# Altium footprint library BTL_PCBLIB.PcbLib: 31 footprints (part 2 of 2)
Each footprint in its own frame and in the unit in brackets; x right, y up, seen from the top. Pads: shape width x height; smd on the part's side, far side on the other; paste and mask are expansions set on the pad; w line width, h text height; cw(c..) or ccw(c..) is an arc to the next point about the centre after c.
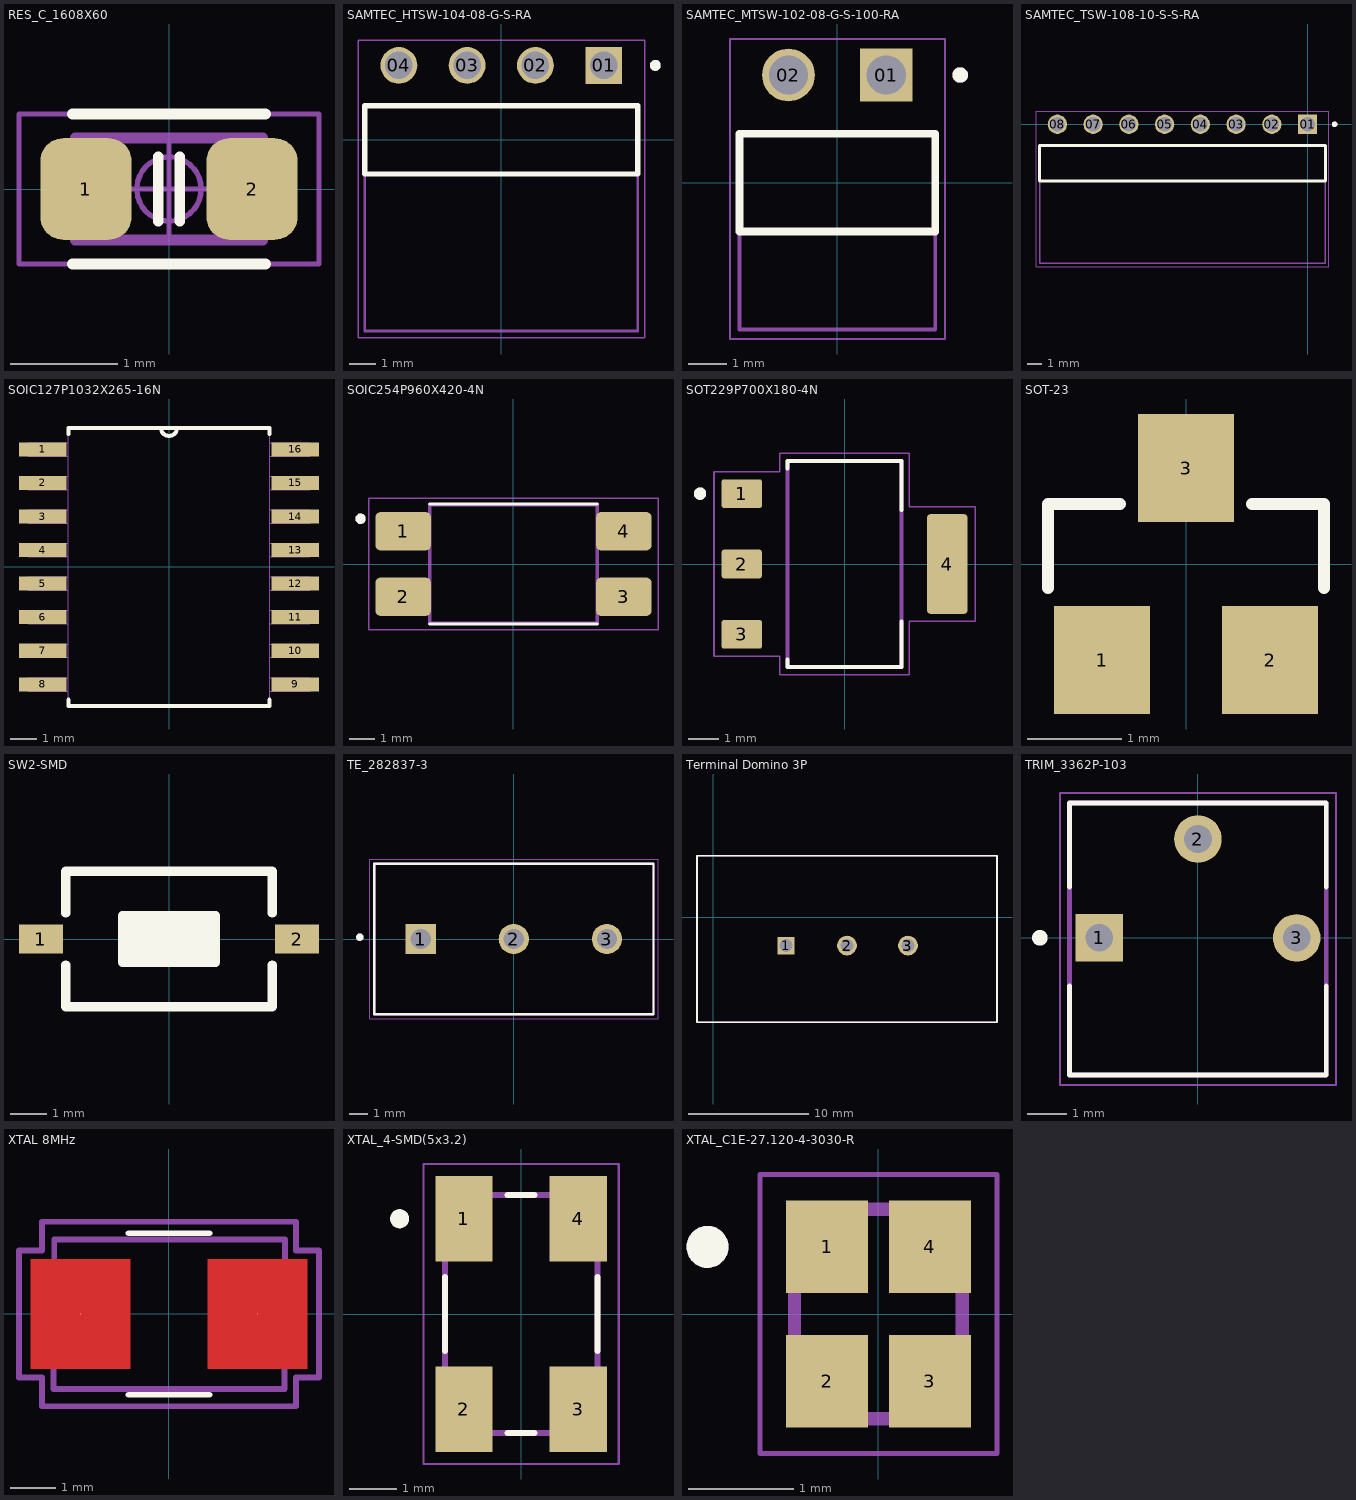
[diagram p1: the footprints below, top view; thin cyan lines are the x and y axes]

## RES_C_1608X60 [mm] "Chip Resistor, 2-Leads, Body 1.63x0.83mm, IPC High Density"
height 0.6
pads (2):
  rrect50% 0.85x0.95 smd: 1(-0.775,0) 2(0.775,0)
Top Overlay:
  lines w0.1: -0.9,-0.7 0.9,-0.7 ; -0.9,0.7 0.9,0.7 ; -0.1,-0.3 -0.1,0.3 ; 0.1,-0.3 0.1,0.3
Top Assembly:
  lines w0.1: -0.875,-0.475 0.875,-0.475 0.875,0.475 -0.875,0.475 -0.875,-0.475
Top Courtyard:
  lines w0.05: -1.4,-0.7 1.4,-0.7 1.4,0.7 -1.4,0.7 -1.4,-0.7
Top Component Outline:
  rectangle: 0.475,-0.475 0.875,0.475
  rectangle: -0.875,-0.475 -0.475,0.475
  lines w0.05: -0.875,-0.475 -0.875,0.475 0.875,0.475 0.875,-0.475 -0.875,-0.475
Top Component Center:
  circle w0.05: c0,0 r0.3
  lines w0.05: -0.5,0 0.5,0 ; 0,-0.5 0,0.5
3D body "RESC1608X60.step": height 0.6, standoff 0, extent -0.875,-0.475 0.875,0.475

## SAMTEC_HTSW-104-08-G-S-RA [mm]
pads (4):
  rect 1.37x1.37 / inner round 1.37 / far side rect 1.37x1.37 hole 1.02: 01(3.81,2.77)
  round 1.37 hole 1.02: 02(1.27,2.77) 03(-1.27,2.77) 04(-3.81,2.77)
Top Overlay:
  circle w0.2: c5.73,2.77 r0.1
  lines w0.2: -5.08,-1.27 -5.08,1.27 5.08,1.27 5.08,-1.27 -5.08,-1.27
Mechanical 13:
  circle w0.2: c5.73,2.77 r0.1
  lines w0.1: -5.08,-1.27 -5.08,1.27 5.08,1.27 5.08,-1.27 ; -5.08,-1.27 5.08,-1.27 ; -5.08,-1.27 -5.08,-7.11 5.08,-7.11 5.08,-1.27
Mechanical 15:
  lines w0.05: -5.33,-7.36 -5.33,3.705 5.33,3.705 5.33,-7.36 -5.33,-7.36
3D body "HTSW-104-08-G-S-RA.stp": height 3.02, standoff -2.31, extent -5.08,-7.15 5.08,3.073

## SAMTEC_MTSW-102-08-G-S-100-RA [mm]
pads (2):
  rect 1.37x1.37 / inner round 1.37 / far side rect 1.37x1.37 hole 1.02: 01(1.27,2.79)
  round 1.37 hole 1.02: 02(-1.27,2.79)
Top Overlay:
  circle w0.2: c3.19,2.79 r0.1
  lines w0.2: -2.54,-1.27 -2.54,1.27 2.54,1.27 2.54,-1.27 -2.54,-1.27
Mechanical 13:
  circle w0.2: c3.19,2.79 r0.1
  lines w0.1: -2.54,-1.27 -2.54,1.27 2.54,1.27 2.54,-1.27 ; -2.54,-1.27 2.54,-1.27 ; -2.54,-1.27 -2.54,-3.81 2.54,-3.81 2.54,-1.27
Mechanical 15:
  lines w0.05: -2.79,-4.06 -2.79,3.725 2.79,3.725 2.79,-4.06 -2.79,-4.06
3D body "MTSW-102-08-G-S-100-RA.stp": height 2.77, standoff -5.84, extent -2.565,-3.766 2.515,3.156

## SAMTEC_TSW-108-10-S-S-RA [mm]
pads (8):
  rect 1.37x1.37 / inner round 1.37 / far side rect 1.37x1.37 hole 1.02: 01(0,0)
  round 1.37 hole 1.02: 02(-2.54,0) 03(-5.08,0) 04(-7.62,0) 05(-10.16,0) 06(-12.7,0) 07(-15.24,0) 08(-17.78,0)
Top Overlay:
  circle w0.2: c1.92,0 r0.1
  lines w0.2: -19.05,-4.04 -19.05,-1.5 1.27,-1.5 1.27,-4.04 -19.05,-4.04
Mechanical 13:
  circle w0.2: c1.92,0 r0.1
  lines w0.1: -19.05,-4.04 -19.05,-1.5 1.27,-1.5 1.27,-4.04 ; -19.05,-4.04 1.27,-4.04 ; -19.05,-4.04 -19.05,-9.88 1.27,-9.88 1.27,-4.04
Mechanical 15:
  lines w0.05: -19.3,-10.13 -19.3,0.935 1.52,0.935 1.52,-10.13 -19.3,-10.13
3D body "TSW-108-10-S-S-RA.stp": height 2.27, standoff -10.66, extent -19.025,-9.944 1.295,0.279

## SOIC127P1032X265-16N [mil]
pads (16):
  rect 71x21 smd: 1(-188,175) 2(-188,125) 3(-188,75) 4(-188,25) 5(-188,-25) 6(-188,-75) 7(-188,-125) 8(-188,-175) 9(188,-175) 10(188,-125) 11(188,-75) 12(188,-25) 13(188,25) 14(188,75) 15(188,125) 16(188,175)
Top Overlay:
  lines w6: -150,-198 -150,-207 150,-207 150,-198 ; -150,198 -150,207 -12,207 ; 150,198 150,207 12,207 ; -12,207 ccw(c0,207) 12,207 ; -12,207 12,207
Mechanical 13:
  lines w0: -12,207 ccw(c0,207) 12,207 ; -12,207 -150,207 -150,-207 150,-207 150,207 12,207 ; -12,207 12,207 ; -210,-185 -150,-185 -150,-165 -210,-165 -210,-185 ; -210,-135 -150,-135 -150,-115 -210,-115 -210,-135 ; -210,-85 -150,-85 -150,-65 -210,-65 -210,-85 ; -210,-35 -150,-35 -150,-15 -210,-15 -210,-35 ; -210,15 -150,15 -150,35 -210,35 -210,15 ; -210,65 -150,65 -150,85 -210,85 -210,65 ; -210,115 -150,115 -150,135 -210,135 -210,115 ; -210,165 -150,165 -150,185 -210,185 -210,165 ; 150,-185 210,-185 210,-165 150,-165 150,-185 ; 150,-135 210,-135 210,-115 150,-115 150,-135 ; 150,-85 210,-85 210,-65 150,-65 150,-85 ; 150,-35 210,-35 210,-15 150,-15 150,-35 ; 150,15 210,15 210,35 150,35 150,15 ; 150,65 210,65 210,85 150,85 150,65 ; 150,115 210,115 210,135 150,135 150,115 ; 150,165 210,165 210,185 150,185 150,165
3D body "step_temp.STEP": height 104.33, standoff 0, extent -203.25,-202.76 203.25,202.76

## SOIC254P960X420-4N [mm]
height 4.2
pads (4):
  rrect25% 2.15x1.48 smd: 1(-4.28,1.27) 2(-4.28,-1.27) 3(4.28,-1.27) 4(4.28,1.27)
Top Overlay:
  circle w0.2: c-5.93,1.755 r0.1
  lines w0.127: -3.25,-2.33 3.25,-2.33 ; -3.25,2.33 3.25,2.33
Mechanical 13:
  circle w0.2: c-5.93,1.755 r0.1
  lines w0.127: -3.25,-2.3 -3.25,2.3 3.25,2.3 3.25,-2.3 -3.25,-2.3
Mechanical 15:
  lines w0.05: -5.605,-2.55 -5.605,2.55 5.605,2.55 5.605,-2.55 -5.605,-2.55
3D body "step_temp.STEP": height 4, standoff 0, extent -4.875,-2.29 4.875,2.29

## SOT229P700X180-4N [mm]
height 1.8
pads (4):
  rrect15% 1.31x0.93 smd: 1(-3.345,2.29) 2(-3.345,0) 3(-3.345,-2.29)
  rrect15% 1.31x3.24 smd: 4(3.345,0)
Top Overlay:
  circle w0.2: c-4.703,2.29 r0.1
  lines w0.127: -1.86,-3.11 -1.86,-3.36 1.86,-3.36 1.86,-1.87 ; -1.86,3.1 -1.86,3.36 1.86,3.36 1.86,1.76
Mechanical 13:
  circle w0.2: c-4.703,2.29 r0.1
  lines w0.127: -1.86,-3.36 -1.86,3.36 1.86,3.36 1.86,-3.36 -1.86,-3.36
Mechanical 15:
  lines w0.05: -4.25,-3.01 -2.11,-3.01 -2.11,-3.61 2.11,-3.61 2.11,-1.87 4.25,-1.87 4.25,1.87 2.11,1.87 2.11,3.61 -2.11,3.61 -2.11,3.01 -4.25,3.01 -4.25,-3.01
3D body "step_temp.STEP": height 1.8, standoff 0, extent -3.499,-3.251 3.499,3.251

## SOT-23 [mil]
pads (3):
  rect 40x45 smd: 1(-35,-40) 2(35,-40) 3(0,40)
Top Overlay:
  lines w5: -57.5,-10 -57.5,25 -27.5,25 ; 27.5,25 57.5,25 57.5,-10
Mechanical 13:
  region: -28,-51 -46,-51 -46,-28 -28,-28
  region: 46,-51.01 28.01,-51.01 28.01,-28 46,-28
  region: 9,28 -9,28 -9,51 9,51
3D body "step_temp.STEP": height 55.12, standoff 0, extent -57.09,-51.18 57.09,51.18

## SW2-SMD [mm]
pads (2):
  rect 1.2x0.8 smd: 1(-3.5,0) 2(3.5,0)
Top Overlay:
  rectangle: -1.27,-0.635 1.27,0.635
  lines w0.254: -2.819,-0.711 -2.819,-1.854 2.819,-1.854 2.819,-0.711 ; -2.819,0.711 -2.819,1.854 2.819,1.854 2.819,0.711 ; -1.27,-0.635 1.27,-0.635 1.27,0.635 -1.27,0.635 -1.27,-0.635
3D body "User Library-Button-SMD.step": height 2.5, standoff 0, extent -3.05,-1.85 3.05,1.85

## TE_282837-3 [mm]
pads (3):
  rect 1.65x1.65 hole 1.1: 1(-5.08,0)
  round 1.65 hole 1.1: 2(0,0) 3(5.08,0)
Top Overlay:
  circle w0.2: c-8.4,0.1 r0.1
  lines w0.127: -7.62,-4.1 7.62,-4.1 7.62,4.1 -7.62,4.1 -7.62,-4.1
Mechanical 13:
  circle w0.2: c-8.4,0.1 r0.1
  lines w0.127: -7.62,-4.1 7.62,-4.1 7.62,4.1 -7.62,4.1 -7.62,-4.1
Mechanical 15:
  lines w0.05: -7.87,-4.35 7.87,-4.35 7.87,4.35 -7.87,4.35 -7.87,-4.35
3D body "282837-3--3DModel-STEP-1.STEP": height 9.95, standoff -3.55, extent -8.204,-4.115 7.636,4.085

## Terminal Domino 3P [mm]
pads (3):
  rect 1.45x1.45 / inner round 1.45 / far side rect 1.45x1.45 hole 1.1: 1(6.074,-2.381)
  round 1.65 hole 1.1: 2(11.154,-2.381) 3(16.234,-2.381)
Top Overlay:
  lines w0.127: -1.346,-8.781 23.654,-8.781 23.654,5.119 -1.346,5.119 -1.346,-8.781
Mechanical 13:
  lines w0.127: -1.346,-8.781 23.654,-8.781 23.654,5.119 -1.346,5.119 -1.346,-8.781

## TRIM_3362P-103 [mm]
pads (3):
  rect 1.222x1.222 / inner round 1.222 / far side rect 1.222x1.222 hole 0.714: 1(-2.54,0)
  round 1.222 hole 0.714: 2(0,2.54) 3(2.54,0)
Top Overlay:
  circle w0.2: c-4.064,0 r0.1
  lines w0.127: -3.3,-3.53 3.3,-3.53 ; -3.3,-3.52 -3.3,-1.235 ; -3.3,1.305 -3.3,3.47 3.3,3.47 3.3,1.305 ; 3.3,-3.52 3.3,-1.235
Mechanical 13:
  lines w0.127: -3.3,-3.53 3.3,-3.53 3.3,3.47 -3.3,3.47 -3.3,-3.53
Mechanical 15:
  lines w0.05: -3.55,-3.78 3.55,-3.78 3.55,3.72 -3.55,3.72 -3.55,-3.78
3D body "step_temp.STEP": height 4.88, standoff -5.84, extent -3.3,-3.495 3.3,3.495

## XTAL 8MHz [mil]
pads (2):
  round 1 smd: 1(-76.69,0) 2(76.69,0)
Top Layer:
  region: -120,47.24 -120,-47.24 -33.39,-47.24 -33.39,47.24
  region: 33.39,47.24 120,47.24 120,-47.24 33.39,-47.24
Top Overlay:
  lines w5: -35,-70 35,-70 ; -35,70 35,70
Mechanical 13:
  lines w5: -100,-65 -99.41,64.49 100.59,64.49 100,-65 -100,-65
Mechanical 15:
  lines w5: -130,-55 -110,-55 -110,-80 110,-80 110,-55 130,-55 130,55 110,55 110,80 -110,80 -110,55 -130,55 -130,-55
3D body "NX5032GA-8MHZ-EXS00A-CG07039.STEP": height 59.06, standoff 0, extent -98.43,-62.99 98.43,62.99

## XTAL_4-SMD(5x3.2) [mm]
height 1.1
pads (4):
  rect 1.2x1.8 smd: 1(-1.2,2) 2(-1.2,-2) 3(1.2,-2) 4(1.2,2)
Top Overlay:
  circle w0.2: c-2.55,2 r0.1
  lines w0.127: -1.6,-0.78 -1.6,0.78 ; -0.28,-2.5 0.28,-2.5 ; -0.28,2.5 0.28,2.5 ; 1.6,-0.78 1.6,0.78
Mechanical 13:
  circle w0.2: c-2.55,2 r0.1
  lines w0.127: -1.6,-2.5 1.6,-2.5 1.6,2.5 -1.6,2.5 -1.6,-2.5
Mechanical 15:
  lines w0.05: -2.05,-3.15 2.05,-3.15 2.05,3.15 -2.05,3.15 -2.05,-3.15
3D body "step_temp.STEP": height 1.1, standoff 0, extent -1.575,-2.5 1.6,2.5

## XTAL_C1E-27.120-4-3030-R [mm]
height 0.5
pads (4):
  rect 0.78x0.88 smd: 1(-0.49,0.64) 2(-0.49,-0.64) 3(0.49,-0.64) 4(0.49,0.64)
Top Overlay:
  circle w0.2: c-1.63,0.64 r0.1
Mechanical 13:
  circle w0.2: c-1.63,0.64 r0.1
  lines w0.127: -0.8,-1 -0.8,1 0.8,1 0.8,-1 -0.8,-1
Mechanical 15:
  lines w0.05: -1.13,-1.33 -1.13,1.33 1.13,1.33 1.13,-1.33 -1.13,-1.33
3D body "step_temp.STEP": height 0.5, standoff 0, extent -0.8,-1 0.8,1